# Altium footprint library SMPSProject.PcbLib: 143 footprints (part 3 of 9)
Each footprint in its own frame and in the unit in brackets; x right, y up, seen from the top. Pads: shape width x height; smd on the part's side, far side on the other; paste and mask are expansions set on the pad; w line width, h text height; cw(c..) or ccw(c..) is an arc to the next point about the centre after c.
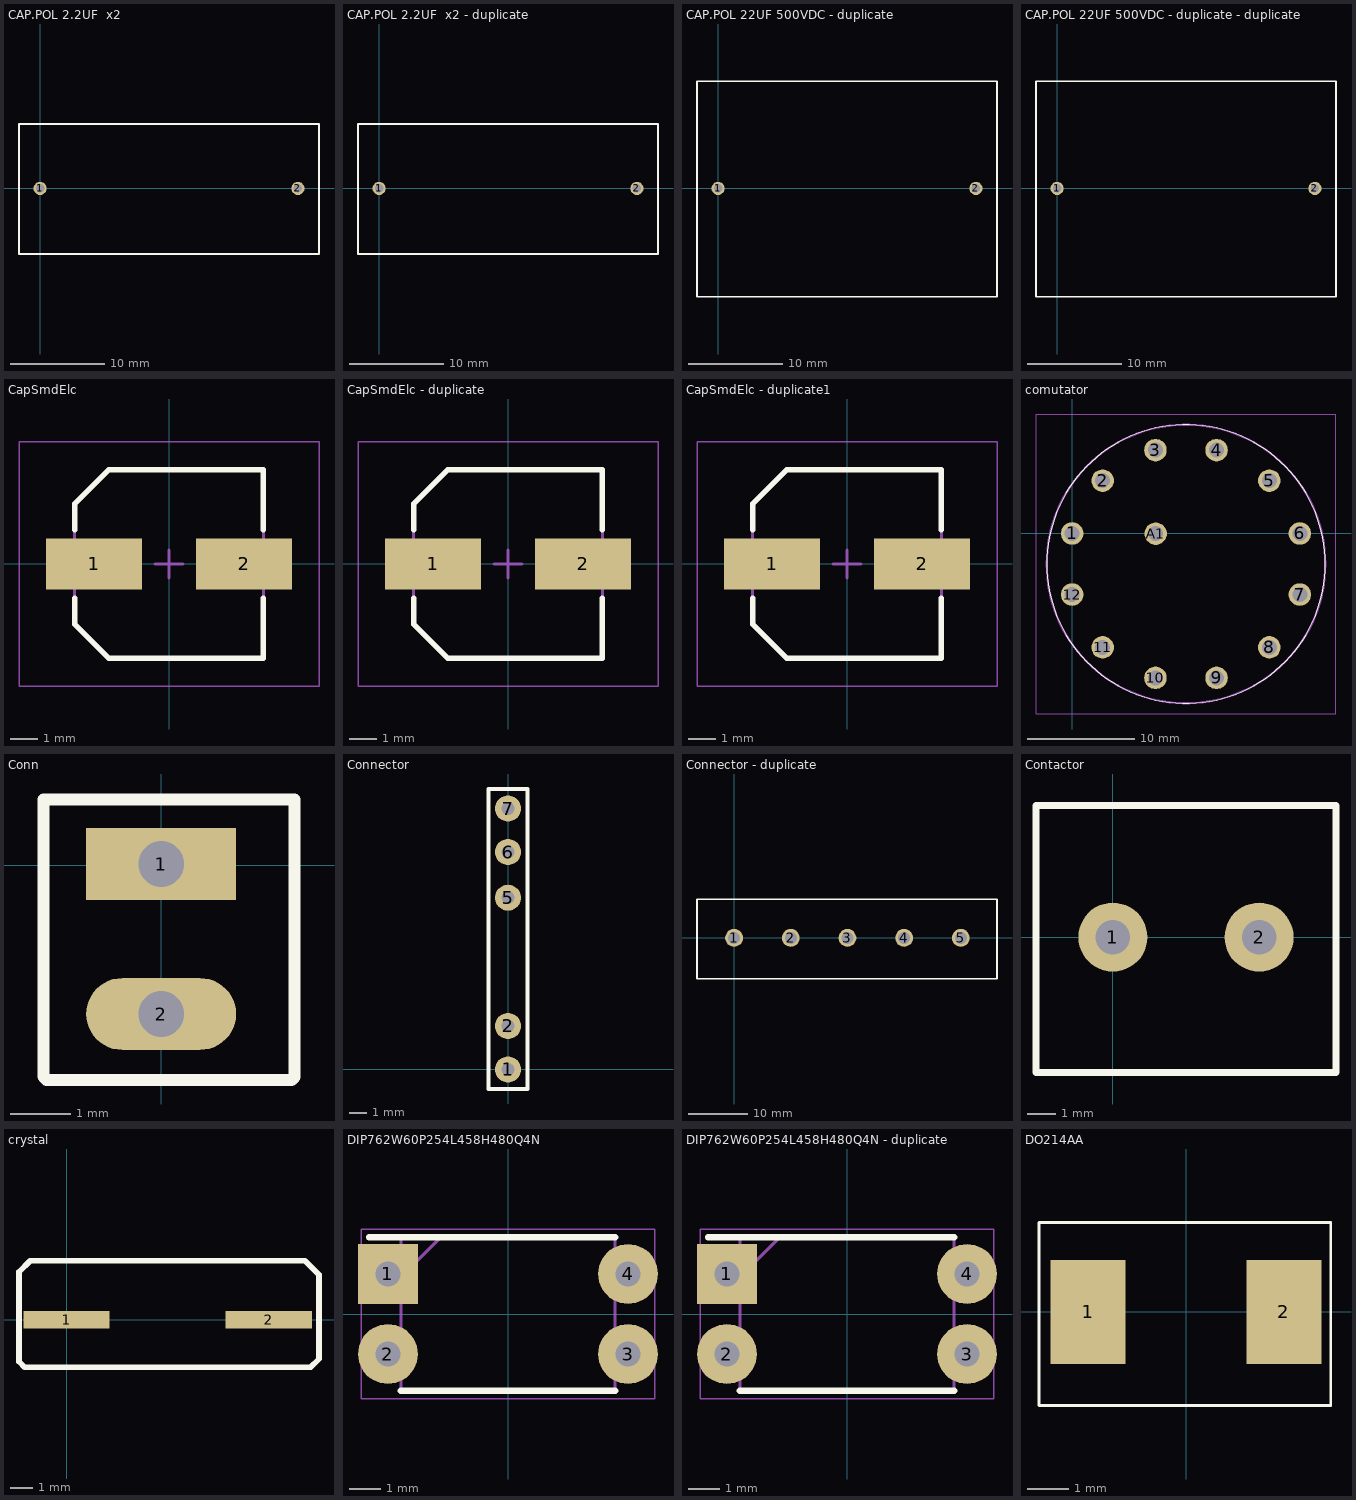
[diagram p2: the footprints below, top view; thin cyan lines are the x and y axes]

## CAP.POL 2.2UF  x2 [mm]
pads (2):
  round 1.4 hole 0.9: 1(0,0) 2(27.5,0)
Top Overlay:
  lines w0.2: -2.25,-6.985 -2.25,-5.807 -2.25,5.693 -2.25,6.858 29.75,6.858 29.75,-6.985 -2.25,-6.985
3D body "c-rect_p27-5_l30_w13_h23.stp": height 23.01, standoff -3.99, extent -1.225,-6.45 28.775,6.55

## CAP.POL 2.2UF  x2 - duplicate [mm]
pads (2):
  round 1.4 hole 0.9: 1(0,0) 2(27.5,0)
Top Overlay:
  lines w0.2: -2.25,-6.985 -2.25,-5.807 -2.25,5.693 -2.25,6.858 29.75,6.858 29.75,-6.985 -2.25,-6.985
3D body "c-rect_p27-5_l30_w13_h23.stp": height 23.01, standoff -3.99, extent -1.225,-6.45 28.775,6.55

## CAP.POL 22UF 500VDC - duplicate [mm]
pads (2):
  round 1.4 hole 0.9: 1(0,0) 2(27.5,0)
Top Overlay:
  lines w0.2: -2.25,-11.557 -2.25,-5.807 -2.25,5.693 -2.25,11.43 29.75,11.43 29.75,-11.557 -2.25,-11.557
3D body "c-rect_p27-5_l30_w13_h23.stp": height 23.01, standoff -3.99, extent -1.225,-6.45 28.775,6.55

## CAP.POL 22UF 500VDC - duplicate - duplicate [mm]
pads (2):
  round 1.4 hole 0.9: 1(0,0) 2(27.5,0)
Top Overlay:
  lines w0.2: -2.25,-11.557 29.75,-11.557 29.75,11.43 -2.25,11.43 -2.25,5.693 -2.25,-5.807 -2.25,-11.557
3D body "c-rect_p27-5_l30_w13_h23.stp": height 23.01, standoff -3.99, extent -1.225,-6.45 28.775,6.55

## CapSmdElc [mm] "Aluminum Electrolytic Capacitor, Body 6.70x6.70x6.30mm, IPC Low Density"
height 6.3
pads (2):
  rect 3.45x1.85 smd: 1(-2.7,0) 2(2.7,0)
Top Overlay:
  lines w0.2: -3.4,-1.225 -3.4,-2.163 -2.163,-3.4 3.4,-3.4 3.4,-1.225 ; -3.4,1.225 -3.4,2.163 -2.163,3.4 3.4,3.4 3.4,1.225
Top Courtyard:
  lines w0.05: -5.4,-4.4 5.4,-4.4 5.4,4.4 -5.4,4.4 -5.4,-4.4
  lines w0.1: -0.5,0 0.5,0 ; 0,-0.5 0,0.5
Top Assembly:
  lines w0.1: -3.4,-2.163 -3.4,2.163 -2.163,3.4 3.4,3.4 3.4,-3.4 -2.163,-3.4 -3.4,-2.163
3D body "User Library-Nichicon_CW6_3x7.STEP": height 6.92, standoff 0.01, extent -3.45,-3.275 3.55,3.325

## CapSmdElc - duplicate [mm] "Aluminum Electrolytic Capacitor, Body 6.70x6.70x6.30mm, IPC Low Density"
height 6.3
pads (2):
  rect 3.45x1.85 smd: 1(-2.7,0) 2(2.7,0)
Top Overlay:
  lines w0.2: -3.4,-1.225 -3.4,-2.163 -2.163,-3.4 3.4,-3.4 3.4,-1.225 ; -3.4,1.225 -3.4,2.163 -2.163,3.4 3.4,3.4 3.4,1.225
Top Courtyard:
  lines w0.05: -5.4,-4.4 -5.4,4.4 5.4,4.4 5.4,-4.4 -5.4,-4.4
  lines w0.1: -0.5,0 0.5,0 ; 0,-0.5 0,0.5
Top Assembly:
  lines w0.1: -3.4,-2.163 -2.163,-3.4 3.4,-3.4 3.4,3.4 -2.163,3.4 -3.4,2.163 -3.4,-2.163
3D body "User Library-Nichicon_CW6_3x7.STEP": height 6.92, standoff 0.01, extent -3.45,-3.275 3.55,3.325

## CapSmdElc - duplicate1 [mm] "Aluminum Electrolytic Capacitor, Body 6.70x6.70x6.30mm, IPC Low Density"
height 6.3
pads (2):
  rect 3.45x1.85 smd: 1(-2.7,0) 2(2.7,0)
Top Overlay:
  lines w0.2: -3.4,-1.225 -3.4,-2.163 -2.163,-3.4 3.4,-3.4 3.4,-1.225 ; -3.4,1.225 -3.4,2.163 -2.163,3.4 3.4,3.4 3.4,1.225
Top Courtyard:
  lines w0.05: -5.4,-4.4 5.4,-4.4 5.4,4.4 -5.4,4.4 -5.4,-4.4
  lines w0.1: -0.5,0 0.5,0 ; 0,-0.5 0,0.5
Top Assembly:
  lines w0.1: -3.4,-2.163 -3.4,2.163 -2.163,3.4 3.4,3.4 3.4,-3.4 -2.163,-3.4 -3.4,-2.163
3D body "User Library-Nichicon_CW6_3x7.STEP": height 6.92, standoff 0.01, extent -3.45,-3.275 3.55,3.325

## comutator [mm]
pads (13):
  round 2.1 hole 1.4: 1(0,0) 2(2.847,4.931) 3(7.778,7.778) 4(13.472,7.778) 5(18.403,4.931) 6(21.25,0) 7(21.25,-5.694) 8(18.403,-10.625) 9(13.472,-13.472) 10(7.778,-13.472) 11(2.847,-10.625) 12(0,-5.694) A1(7.797,-0.019)
Top Overlay:
  lines w0.1: -2.375,-2.847 ccw(c10.625,-2.847) 23.625,-2.847 ccw(c10.625,-2.847) -2.375,-2.847
Mechanical 13:
  lines w0.2: -2.375,-2.847 ccw(c10.625,-2.847) 23.625,-2.847 ccw(c10.625,-2.847) -2.375,-2.847
Mechanical 15:
  lines w0.1: -3.375,-16.847 24.625,-16.847 24.625,11.153 -3.375,11.153 -3.375,-16.847
3D body "SR2612F-0112-38F5B-D8-S.stp": height 34.1, standoff -5, extent -2.375,-15.847 23.625,10.153

## Conn [mm]
pads (2):
  rect 2.5x1.2 hole 0.762 square: 1(0,0.025)
  oval 2.5x1.2 hole 0.762 square: 2(0,-2.475)
Top Overlay:
  lines w0.2: -1.965,-3.52 -1.965,1.1 2.225,1.1 2.225,-3.525 2.175,-3.575 -1.91,-3.575 -1.965,-3.52

## Connector [mil]
pads (5):
  round 60 hole 30: 1(0,0) 2(0,100) 5(0,395) 6(0,500) 7(0,600)
Top Overlay:
  lines w10: -45,-45 45,-45 45,620 45,645 -45,645 -45,-45
3D body "User Library-BG301-03-A-0540-L-B 2_54mm SMD Header v8.step": height 311.52, standoff -117.61, extent -45,345 53.43,645
3D body "User Library-BG301-02-A-0540-L-B 2_54mm SMD Header v8.step": height 311.52, standoff -117.61, extent -38.43,-50 60,150

## Connector - duplicate [mm]
pads (5):
  round 3 hole 2: 1(0,0) 2(9.5,0) 3(19,0) 4(28.5,0) 5(38,0)
Top Overlay:
  lines w0.254: -6.223,-6.858 44.069,-6.858 44.069,6.477 -2.032,6.477 -6.223,6.477 -6.223,-6.858

## Contactor [mm]
pads (2):
  round 2.4 hole 1.2: 1(0,0) 2(5.08,0)
Top Overlay:
  lines w0.254: -2.667,-4.699 -2.667,4.572 7.747,4.572 7.747,-4.699 -2.667,-4.699
3D body "User Library-2 Way PCB Screw Terminal Block 5_08mm.STEP": height 15.21, standoff -3.49, extent -2.54,-4.572 7.62,4.428

## crystal [mm]
pads (2):
  rect 3.9x0.8 smd: 1(0,0) 2(9.153,0)
Top Overlay:
  lines w0.254: -2.159,-1.905 -1.905,-2.159 11.049,-2.159 11.43,-1.778 11.43,2.032 10.795,2.667 -1.651,2.667 -2.159,2.159 -2.159,-1.905
3D body "User Library-SMU4.STEP": height 4.01, standoff 0.01, extent -1.669,-2.273 10.832,2.527

## DIP762W60P254L458H480Q4N [mm]
pads (4):
  rect 1.9x1.9 hole 0.8: 1(-3.81,1.27)
  round 1.9 hole 0.8: 2(-3.81,-1.27) 3(3.81,-1.27) 4(3.81,1.27)
Top Overlay:
  lines w0.2: -4.41,2.44 3.4,2.44 ; -3.4,-2.44 3.4,-2.44
Mechanical 13:
  lines w0.1: -3.4,1.17 -2.13,2.44 ; -3.4,-2.44 3.4,-2.44 3.4,2.44 -3.4,2.44 -3.4,-2.44
Mechanical 15:
  lines w0.05: -4.66,-2.69 4.66,-2.69 4.66,2.69 -4.66,2.69 -4.66,-2.69
3D body "EL817(C).stp": height 4.8, standoff -3.5, extent -3.96,-2.29 3.96,2.29

## DIP762W60P254L458H480Q4N - duplicate [mm]
pads (4):
  rect 1.9x1.9 hole 0.8: 1(-3.81,1.27)
  round 1.9 hole 0.8: 2(-3.81,-1.27) 3(3.81,-1.27) 4(3.81,1.27)
Top Overlay:
  lines w0.2: -4.41,2.44 3.4,2.44 ; -3.4,-2.44 3.4,-2.44
Mechanical 13:
  lines w0.1: -3.4,1.17 -2.13,2.44 ; -3.4,-2.44 3.4,-2.44 3.4,2.44 -3.4,2.44 -3.4,-2.44
Mechanical 15:
  lines w0.05: -4.66,-2.69 4.66,-2.69 4.66,2.69 -4.66,2.69 -4.66,-2.69
3D body "EL817(C).stp": height 4.8, standoff -3.5, extent -3.96,-2.29 3.96,2.29

## DO214AA [mm]
pads (2):
  rect 1.8x2.5 smd: 1(-2.35,0) 2(2.35,0)
Top Overlay:
  lines w0.07: -3.525,-2.25 3.475,-2.25 3.475,2.15 -3.525,2.15 -3.525,1.025 -3.525,-2.25
3D body "User Library-DO-214AA(SMB).STEP": height 2.48, standoff -0.35, extent -2.84,-2.025 2.838,1.925